# Altium schematic symbol library relay.SCHLIB: 425 symbols (part 2 of 3) (continued)
## SDS-S2
designator K?, comment RELAY   monostable, 2 x norm. open, 2 x norm. closed, 5 A/250 V AC/DC, NAiS
OC_FARNELL: unknown; OC_NEWARK: unknown
footprint SDS-S2
part A pins: 1, 12 2
part B pins: P4 P, S4 S
part C pins: P2 P, S2 S
part D pins: O1 O, P1 P
part E pins: O3 O, P3 P

## SDS-ST2
designator K?, comment RELAY   polarity, 2 x norm. open, NAiS
OC_FARNELL: unknown; OC_NEWARK: unknown
footprint SDS-ST2
part A pins: 1, 4 2
part B pins: P1 P, S1 S
part C pins: P2 P, S2 S

## SF2-*
designator K?, comment POLARISED, MONOSTABLE RELAY WITH FORCIBLY GUIDED CONTACTS NAiS   Source: http://www.mew-europe.com/.. en_ds_61404_0001.pdf
MPN: SF2-12V; MPN: SF2-24V; MF: FARNELL; OC_FARNELL: 625875; OC_NEWARK: 68C0655; OC_FARNELL: unknown; OC_NEWARK: unknown; OC_FARNELL: 1124064; OC_NEWARK: 31M0404
footprint SF2
part A pins: 1 +, 2 -
part B pins: 5 O, 6 P
part C pins: 11 P, 12 O
part D pins: 7 P, 8 S
part E pins: 9 S, 10 P

## SF3-*
designator K?, comment POLARISED, MONOSTABLE RELAY WITH FORCIBLY GUIDED CONTACTS NAiS   Source: http://www.mew-europe.com/.. en_ds_61404_0001.pdf
OC_FARNELL: unknown; OC_NEWARK: unknown
footprint SF2
part A pins: 1 +, 2 -
part B pins: 5 O, 6 P
part C pins: 7 P, 8 S
part D pins: 9 S, 10 P
part E pins: 11 P, 12 S

## SF4D-*
designator K?, comment POLARISED, MONOSTABLE RELAY WITH FORCIBLY GUIDED DOUBLE CONTACTS NAiS   Source: http://www.mew-europe.com/.. en_ds_61407_0002.pdf
OC_FARNELL: unknown; OC_NEWARK: unknown
footprint SF4D
part A pins: 1 +, 2 -
part B pins: 5 O, 6 P
part C pins: 7 P, 8 S
part D pins: 9 S, 10 P
part E pins: 11 P, 12 O
part F pins: 13 S, 14 P
part G pins: 15 P, 16 O
part H pins: 17 O, 18 P
part I pins: 19 P, 20 S

## SN*R1
designator K?, comment Slim PCB Relay 1 pole 6 A SCHRACK   Source: http://www.schrack.com/.. 5815.pdf
OC_FARNELL: unknown; OC_NEWARK: unknown
footprint SNR-V1
part A pins: A1 1, A2 2
part B pins: 11 P, 14 S

## SN*R6
designator K?, comment Slim PCB Relay 1 pole 6 A SCHRACK   Source: http://www.schrack.com/.. 5815.pdf
OC_FARNELL: unknown; OC_NEWARK: unknown
footprint SNR-H6
part A pins: A1 1, A2 2
part B pins: 11 P, 14 S

## SNR?*0
designator K?, comment Slim PCB Relay 1 pole 6 A SCHRACK   Source: http://www.schrack.com/.. 5815.pdf
OC_FARNELL: unknown; OC_NEWARK: unknown
footprint SNR-V
part A pins: A1 1, A2 2
part B pins: 11 P, 12 O, 14 S

## SNR?*5
designator K?, comment Slim PCB Relay 1 pole 6 A SCHRACK   Source: http://www.schrack.com/.. 5815.pdf
OC_FARNELL: unknown; OC_NEWARK: unknown
footprint SNR-H
part A pins: A1 1, A2 2
part B pins: 11 P, 12 O, 14 S

## SR2X5*
designator K?, comment Safety Relay 2 pole 6 A SCHRACK   Source: http://www.schrack.com/.. 5809.pdf
OC_FARNELL: unknown; OC_NEWARK: unknown
footprint SR2X
part A pins: A1 1, A2 2
part B pins: 21 O, 22 P
part C pins: 13 S, 14 P

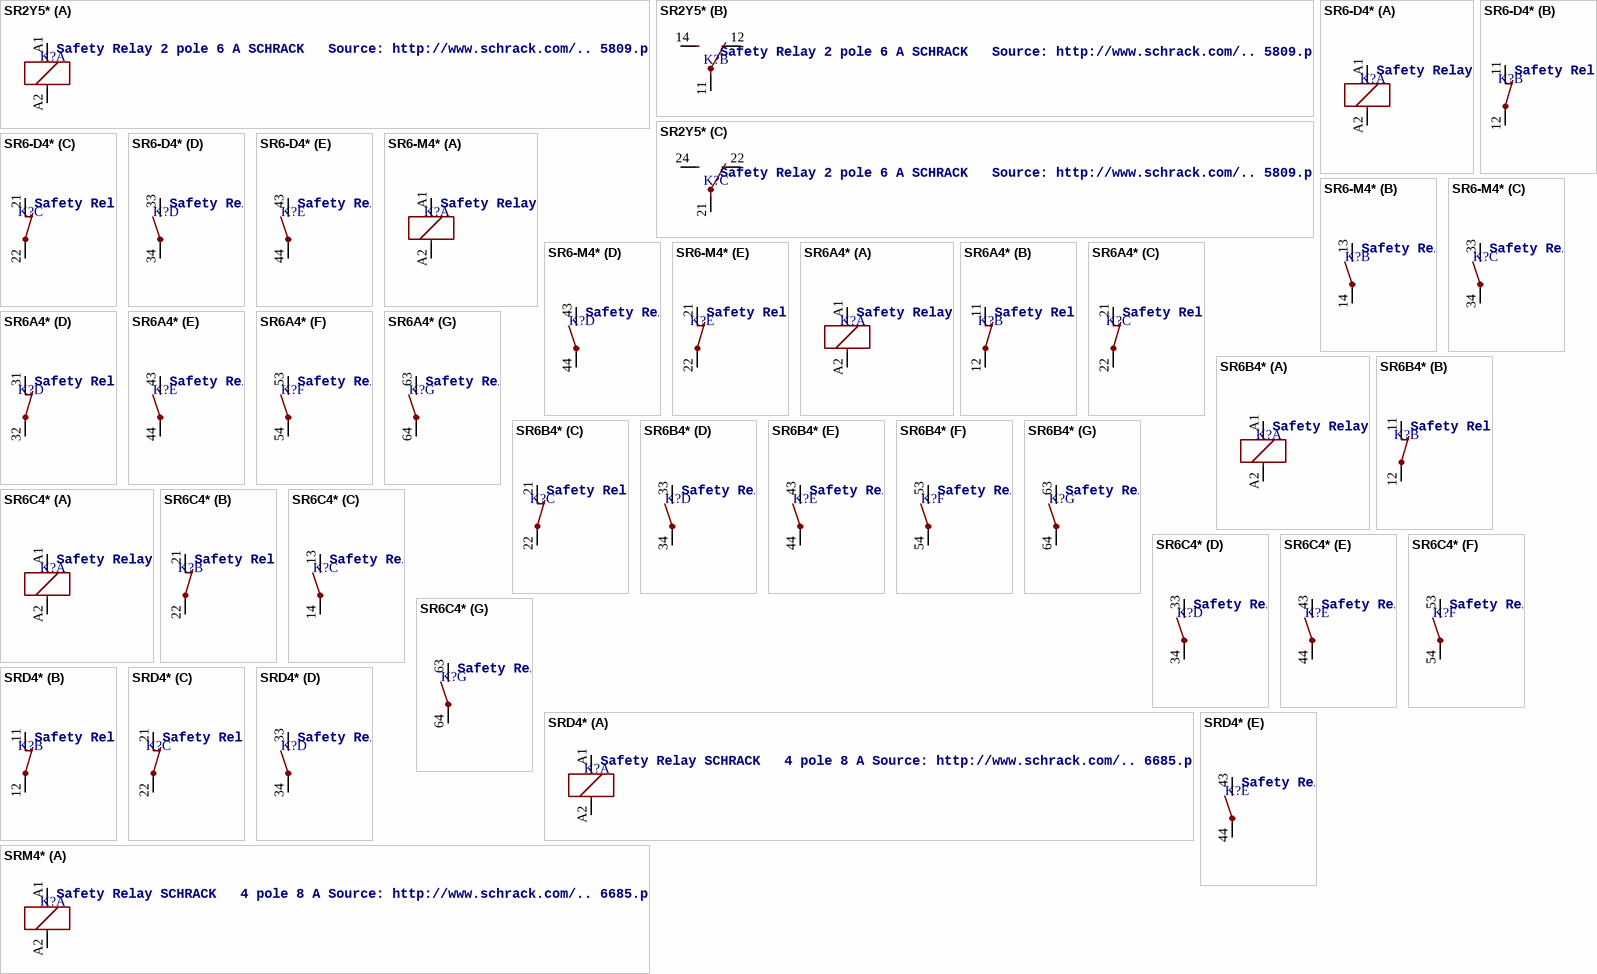
[diagram p28: symbols SR2Y5* to SRM4*]

## SR2Y5*
designator K?, comment Safety Relay 2 pole 6 A SCHRACK   Source: http://www.schrack.com/.. 5809.pdf
OC_FARNELL: unknown; OC_NEWARK: unknown
footprint SR2Y
part A pins: A1 1, A2 2
part B pins: 11 P, 12 O, 14 S
part C pins: 21 P, 22 O, 24 S

## SR6-D4*
designator K?, comment Safety Relay 4 pole 8 A SCHRACK   2 N/O contact and 2 N/C contact Source: http://www.schrack.com/.. 5814.pdf
MPN: SR6D4012; MPN: SR6D4024; MPN: SR6D4110; OC_FARNELL: unknown; OC_NEWARK: unknown; OC_FARNELL: 1770622; OC_NEWARK: 51R7440; OC_FARNELL: 1770623; OC_NEWARK: 51R7441; OC_NEWARK: 16R7721
footprint SR6-D
part A pins: A1 1, A2 2
part B pins: 11 O, 12 P
part C pins: 21 O, 22 P
part D pins: 33 S, 34 P
part E pins: 43 S, 44 P

## SR6-M4*
designator K?, comment Safety Relay 4 pole 8 A SCHRACK   3 N/O contact and 1 N/C contact Source: http://www.schrack.com/.. 5814.pdf
MPN: SR6M4012; MPN: SR6M4024; OC_FARNELL: unknown; OC_NEWARK: unknown; OC_FARNELL: 1770624; OC_NEWARK: 51R7442; OC_FARNELL: 1770625; OC_NEWARK: 51R7443
footprint SR6-M
part A pins: A1 1, A2 2
part B pins: 13 S, 14 P
part C pins: 33 S, 34 P
part D pins: 43 S, 44 P
part E pins: 21 O, 22 P

## SR6A4*
designator K?, comment Safety Relay SR6 SCHRACK   sensitive 6 pole 8 A Source: http://www.schrack.com/.. 6688.pdf
OC_FARNELL: unknown; OC_NEWARK: unknown
footprint SR6A
part A pins: A1 1, A2 2
part B pins: 11 O, 12 P
part C pins: 21 O, 22 P
part D pins: 31 O, 32 P
part E pins: 43 S, 44 P
part F pins: 53 S, 54 P
part G pins: 63 S, 64 P

## SR6B4*
designator K?, comment Safety Relay SR6 SCHRACK   sensitive 6 pole 8 A Source: http://www.schrack.com/.. 6688.pdf
OC_FARNELL: unknown; OC_NEWARK: unknown
footprint SR6B
part A pins: A1 1, A2 2
part B pins: 11 O, 12 P
part C pins: 21 O, 22 P
part D pins: 33 S, 34 P
part E pins: 43 S, 44 P
part F pins: 53 S, 54 P
part G pins: 63 S, 64 P

## SR6C4*
designator K?, comment Safety Relay SR6 SCHRACK   sensitive 6 pole 8 A Source: http://www.schrack.com/.. 6688.pdf
OC_FARNELL: unknown; OC_NEWARK: unknown
footprint SR6C
part A pins: A1 1, A2 2
part B pins: 21 O, 22 P
part C pins: 13 S, 14 P
part D pins: 33 S, 34 P
part E pins: 43 S, 44 P
part F pins: 53 S, 54 P
part G pins: 63 S, 64 P

## SRD4*
designator K?, comment Safety Relay SCHRACK   4 pole 8 A Source: http://www.schrack.com/.. 6685.pdf
OC_FARNELL: unknown; OC_NEWARK: unknown
footprint SR4
part A pins: A1 1, A2 2
part B pins: 11 O, 12 P
part C pins: 21 O, 22 P
part D pins: 33 S, 34 P
part E pins: 43 S, 44 P

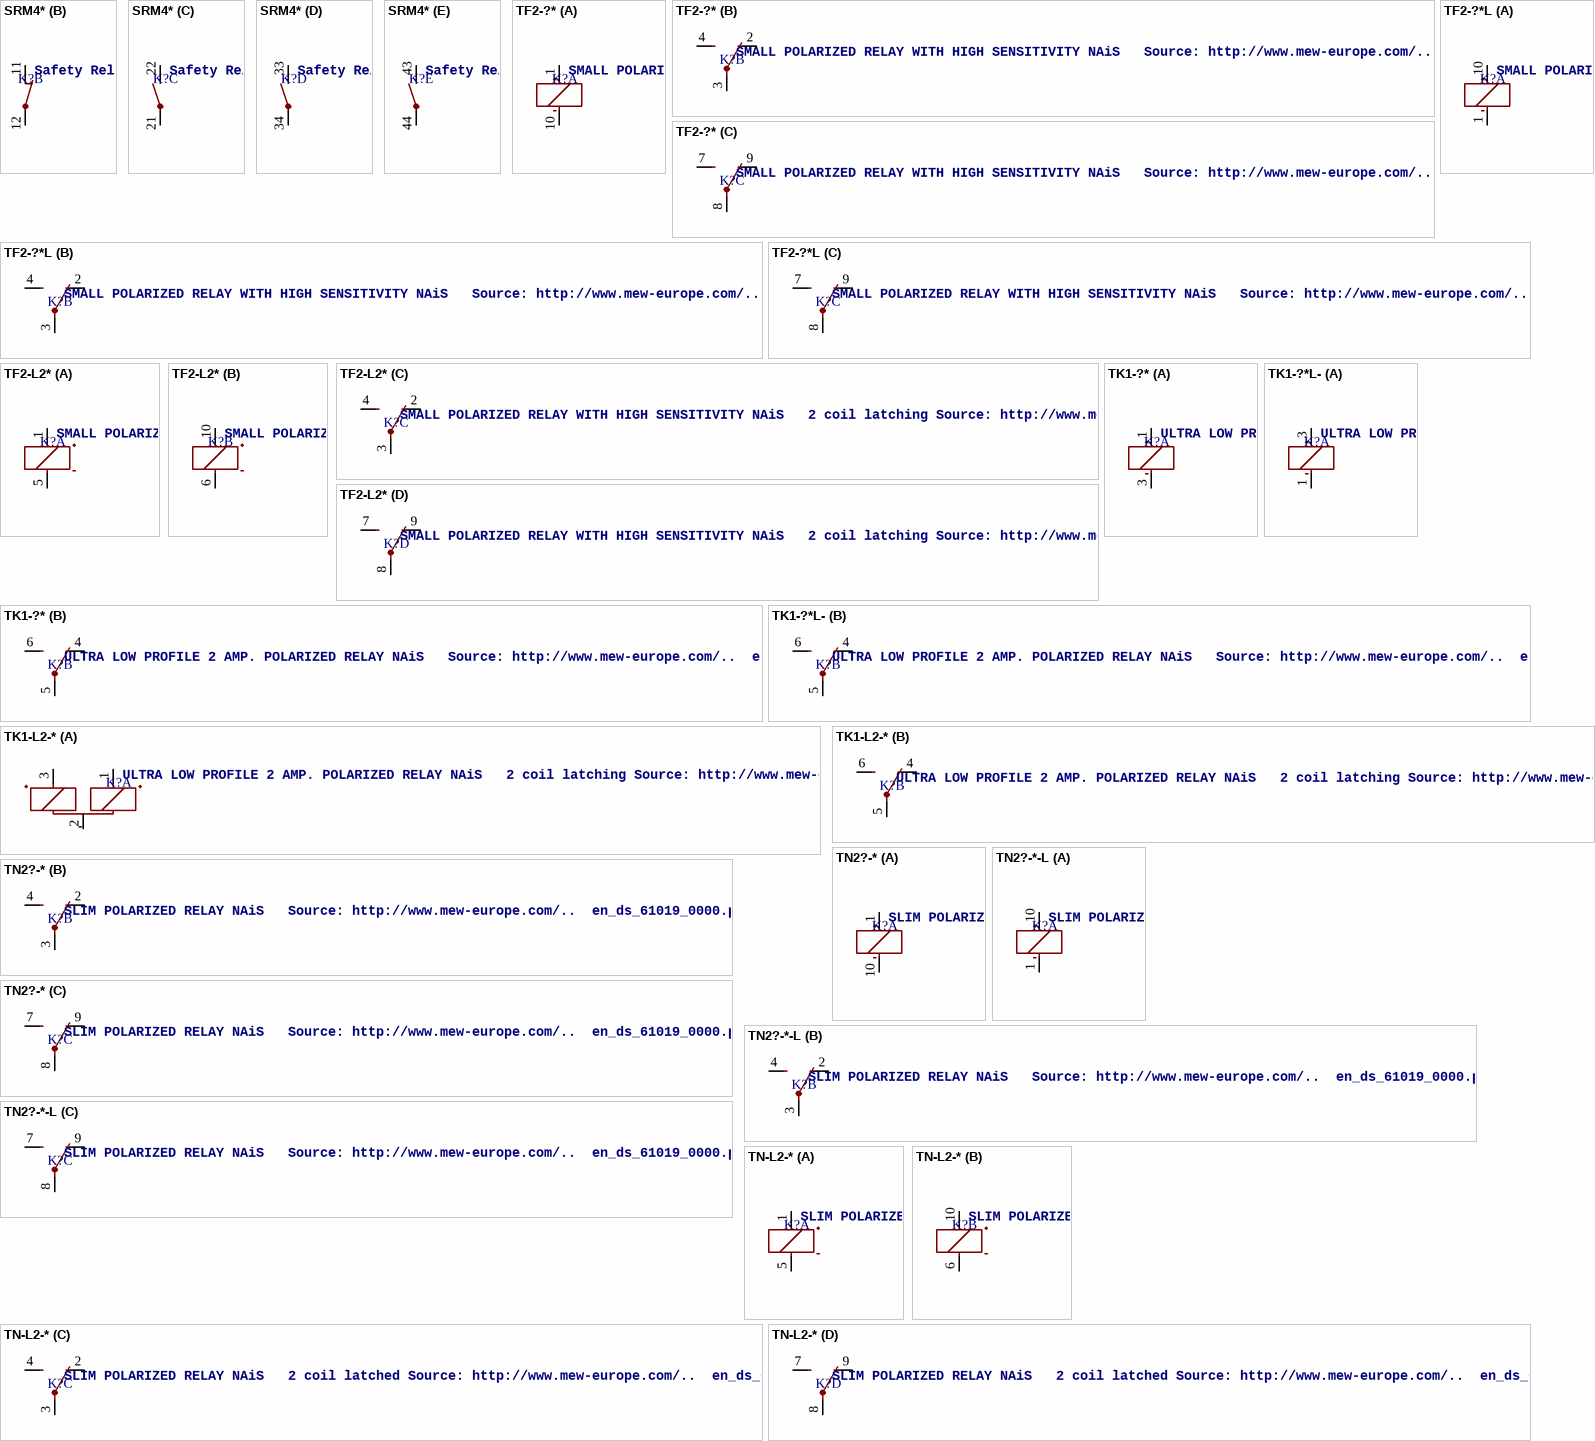
[diagram p29: symbols SRM4* to TN-L2-*]

## SRM4*
designator K?, comment Safety Relay SCHRACK   4 pole 8 A Source: http://www.schrack.com/.. 6685.pdf
OC_FARNELL: unknown; OC_NEWARK: unknown
footprint SR4
part A pins: A1 1, A2 2
part B pins: 11 O, 12 P
part C pins: 21 P, 22 S
part D pins: 33 S, 34 P
part E pins: 43 S, 44 P

## TF2-?*
designator K?, comment SMALL POLARIZED RELAY WITH HIGH SENSITIVITY NAiS   Source: http://www.mew-europe.com/..  en_ds_61017_0000.pdf
OC_FARNELL: unknown; OC_NEWARK: unknown
footprint TF2
part A pins: 1 +, 10 -
part B pins: 2 O, 3 P, 4 S
part C pins: 7 S, 8 P, 9 O

## TF2-?*L
designator K?, comment SMALL POLARIZED RELAY WITH HIGH SENSITIVITY NAiS   Source: http://www.mew-europe.com/..  en_ds_61017_0000.pdf
OC_FARNELL: 846004; OC_NEWARK: unknown; OC_FARNELL: unknown
footprint TF2
part A pins: 1 -, 10 +
part B pins: 2 O, 3 P, 4 S
part C pins: 7 S, 8 P, 9 O

## TF2-L2*
designator K?, comment SMALL POLARIZED RELAY WITH HIGH SENSITIVITY NAiS   2 coil latching Source: http://www.mew-europe.com/..  en_ds_61017_0000.pdf
OC_FARNELL: unknown; OC_NEWARK: unknown
footprint TF2
part A pins: 1 +, 5 -
part B pins: 6 -, 10 +
part C pins: 2 O, 3 P, 4 S
part D pins: 7 S, 8 P, 9 O

## TK1-?*
designator K?, comment ULTRA LOW PROFILE 2 AMP. POLARIZED RELAY NAiS   Source: http://www.mew-europe.com/..  en_ds_61018_0000.pdf
MPN: TK1-12V; MPN: TK1-24V; MPN: TK1-3V; MPN: TK1-4.5V; MPN: TK1-5V; MPN: TK1-6V; MPN: TK1-9V; MF: AROMAT/ MATSUSHITA; OC_FARNELL: unknown; OC_NEWARK: unknown; OC_FARNELL: 1380961; OC_NEWARK: 67K1254; OC_NEWARK: 64K3182; OC_NEWARK: 13P9053; OC_NEWARK: 13P9054; OC_FARNELL: 1380960; OC_NEWARK: 64K3183; OC_NEWARK: 13P9056; OC_NEWARK: 10C9734
footprint TK
part A pins: 1 +, 3 -
part B pins: 4 O, 5 P, 6 S

## TK1-?*L-
designator K?, comment ULTRA LOW PROFILE 2 AMP. POLARIZED RELAY NAiS   Source: http://www.mew-europe.com/..  en_ds_61018_0000.pdf
MPN: TK1-L-1.5V; MPN: TK1-L-12V; MPN: TK1-L-3V; MPN: TK1-L-5V; MPN: TK1-L-6V; MF: AROMAT/ MATSUSHITA; OC_FARNELL: unknown; OC_NEWARK: 10C9715; OC_NEWARK: 15P9750; OC_NEWARK: unknown; OC_NEWARK: 10C9718; OC_NEWARK: 10C9720; OC_NEWARK: 13P9050
footprint TK
part A pins: 1 -, 3 +
part B pins: 4 O, 5 P, 6 S

## TK1-L2-*
designator K?, comment ULTRA LOW PROFILE 2 AMP. POLARIZED RELAY NAiS   2 coil latching Source: http://www.mew-europe.com/..  en_ds_61018_0000.pdf
MPN: TK1-L2-12V; MPN: TK1-L2-24V; MPN: TK1-L2-3V; MPN: TK1-L2-4.5V; MPN: TK1-L2-5V; OC_FARNELL: unknown; OC_NEWARK: unknown; OC_NEWARK: 15P9751; OC_NEWARK: 15P9752; OC_NEWARK: 15P9753; OC_NEWARK: 15P9754; OC_NEWARK: 15P9755
footprint TK
part A pins: 1 R+, 2 -, 3 S+
part B pins: 4 O, 5 P, 6 S

## TN2?-*
designator K?, comment SLIM POLARIZED RELAY NAiS   Source: http://www.mew-europe.com/..  en_ds_61019_0000.pdf
MPN: TN2-12V; MPN: TN2-24V; MPN: TN2-3V; MPN: TN2-4.5V; MPN: TN2-48V; MPN: TN2-5V; MPN: TN2-6V; MPN: TN2-9V; MF: AROMAT/ MATSUSHITA; OC_FARNELL: 1200956; OC_NEWARK: 65K1079; OC_FARNELL: 910405; OC_NEWARK: 64K3187; OC_FARNELL: unknown; OC_NEWARK: 90F3177; OC_FARNELL: 1231845; OC_NEWARK: 64K3188; OC_NEWARK: 13P9184; OC_FARNELL: 1200955; OC_NEWARK: 64K3189; OC_NEWARK: 90F3180; OC_NEWARK: 90F3181
footprint TN2
part A pins: 1 +, 10 -
part B pins: 2 O, 3 P, 4 S
part C pins: 7 S, 8 P, 9 O

## TN2?-*-L
designator K?, comment SLIM POLARIZED RELAY NAiS   Source: http://www.mew-europe.com/..  en_ds_61019_0000.pdf
MPN: TN2-L-12V; MPN: TN2-L-3V; MPN: TN2-L-4.5V; MPN: TN2-L-6V; MF: AROMAT/ MATSUSHITA; OC_FARNELL: unknown; OC_NEWARK: 90F3171; OC_NEWARK: unknown; OC_NEWARK: 90F3184; OC_NEWARK: 15P9757; OC_NEWARK: 90F3169
footprint TN2
part A pins: 1 -, 10 +
part B pins: 2 O, 3 P, 4 S
part C pins: 7 S, 8 P, 9 O

## TN-L2-*
designator K?, comment SLIM POLARIZED RELAY NAiS   2 coil latched Source: http://www.mew-europe.com/..  en_ds_61019_0000.pdf
OC_FARNELL: unknown; OC_NEWARK: unknown
footprint TN2
part A pins: 1 +, 5 -
part B pins: 6 -, 10 +
part C pins: 2 O, 3 P, 4 S
part D pins: 7 S, 8 P, 9 O

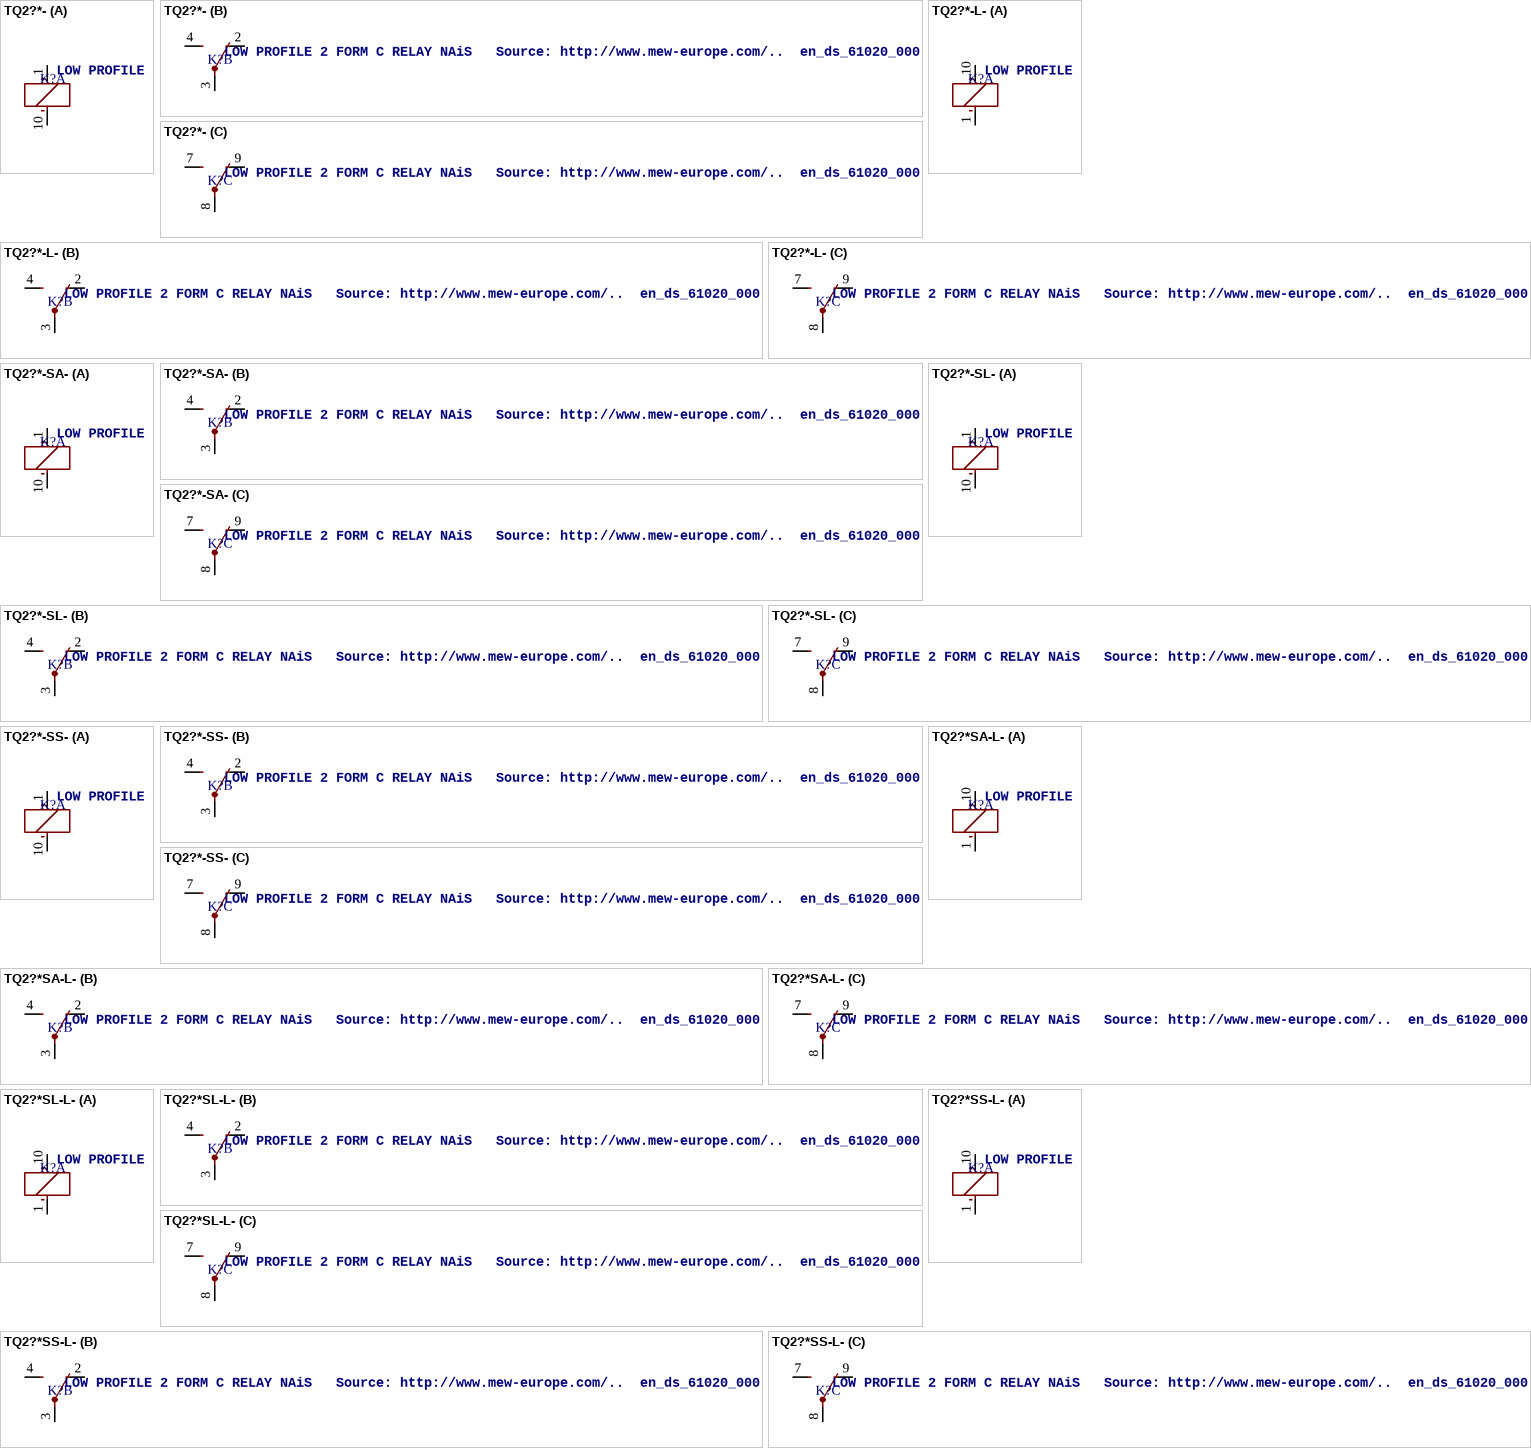
[diagram p30: symbols TQ2?*- to TQ2?*SS-L-]

## TQ2?*-
designator K?, comment LOW PROFILE 2 FORM C RELAY NAiS   Source: http://www.mew-europe.com/..  en_ds_61020_0001.pdf Source: http://www.mew-europe.com/..  en_ds_61020_0004.pdf
MPN: TQ2-12V; MPN: TQ2-24V; MPN: TQ2-3V; MPN: TQ2-4.5V; MPN: TQ2-48V; MPN: TQ2-5V; MPN: TQ2-6V; MPN: TQ2-9V; MF: AROMAT/ MATSUSHITA; OC_FARNELL: 1200949; OC_NEWARK: 64K3197; OC_FARNELL: 1175717; OC_NEWARK: 64K3198; OC_FARNELL: 1703746; OC_NEWARK: 73K2455; OC_FARNELL: 1163566; OC_NEWARK: 64K3199; OC_FARNELL: unknown; OC_NEWARK: 13P9197; OC_FARNELL: 1175716; OC_NEWARK: 64K3200; OC_NEWARK: 64K3201; OC_NEWARK: 13P9201
footprint TQ2
part A pins: 1 +, 10 -
part B pins: 2 O, 3 P, 4 S
part C pins: 7 S, 8 P, 9 O

## TQ2?*-L-
designator K?, comment LOW PROFILE 2 FORM C RELAY NAiS   Source: http://www.mew-europe.com/..  en_ds_61020_0001.pdf Source: http://www.mew-europe.com/..  en_ds_61020_0004.pdf
MPN: TQ2-L-12V; MPN: TQ2-L-3V; MPN: TQ2-L-4.5V; MPN: TQ2-L-5V; MF: AROMAT/ MATSUSHITA; OC_FARNELL: unknown; OC_NEWARK: 64K3190; OC_NEWARK: unknown; OC_NEWARK: 87F3168; OC_NEWARK: 15P9767; OC_FARNELL: 1448361; OC_NEWARK: 64K3191
footprint TQ2
part A pins: 1 -, 10 +
part B pins: 2 O, 3 P, 4 S
part C pins: 7 S, 8 P, 9 O

## TQ2?*-SA-
designator K?, comment LOW PROFILE 2 FORM C RELAY NAiS   Source: http://www.mew-europe.com/..  en_ds_61020_0001.pdf Source: http://www.mew-europe.com/..  en_ds_61020_0004.pdf
MPN: TQ2SA-1.5V-Z; MPN: TQ2SA-12V; MPN: TQ2SA-24V; MPN: TQ2SA-3V; MPN: TQ2SA-4.5V; MPN: TQ2SA-48V; MPN: TQ2SA-5V; MPN: TQ2SA-6V; MPN: TQ2SA-9V; MF: AROMAT/ MATSUSHITA; OC_FARNELL: unknown; OC_NEWARK: 13P9205; OC_FARNELL: 1124056; OC_NEWARK: 64K3203; OC_NEWARK: 13P9208; OC_NEWARK: 10C9847; OC_NEWARK: 92B3979; OC_NEWARK: 13P9215; OC_FARNELL: 1124054; OC_NEWARK: 64K3205; OC_NEWARK: 13P9219; OC_NEWARK: 13P9220
footprint TQ-SA
part A pins: 1 +, 10 -
part B pins: 2 O, 3 P, 4 S
part C pins: 7 S, 8 P, 9 O

## TQ2?*-SL-
designator K?, comment LOW PROFILE 2 FORM C RELAY NAiS   Source: http://www.mew-europe.com/..  en_ds_61020_0001.pdf Source: http://www.mew-europe.com/..  en_ds_61020_0004.pdf
MPN: TQ2SL-12V; MPN: TQ2SL-24V; MPN: TQ2SL-3V; MPN: TQ2SL-5V; OC_FARNELL: unknown; OC_NEWARK: unknown; OC_NEWARK: 13P9222; OC_NEWARK: 13P9224; OC_NEWARK: 13P9226; OC_NEWARK: 13P9228
footprint TQ-SL
part A pins: 1 +, 10 -
part B pins: 2 O, 3 P, 4 S
part C pins: 7 S, 8 P, 9 O

## TQ2?*-SS-
designator K?, comment LOW PROFILE 2 FORM C RELAY NAiS   Source: http://www.mew-europe.com/..  en_ds_61020_0001.pdf Source: http://www.mew-europe.com/..  en_ds_61020_0004.pdf
MPN: TQ2SS-1.5V; MPN: TQ2SS-12V; MPN: TQ2SS-24V-Z; MPN: TQ2SS-3V; MPN: TQ2SS-4.5V; MPN: TQ2SS-48V; MPN: TQ2SS-5V; MF: AROMAT/ MATSUSHITA; OC_FARNELL: unknown; OC_NEWARK: 13P9230; OC_NEWARK: 13P9231; OC_NEWARK: 13P9232; OC_NEWARK: 10C9995; OC_NEWARK: 13P9234; OC_NEWARK: 11C0002; OC_NEWARK: 11C0005; OC_NEWARK: unknown
footprint TQ-SS
part A pins: 1 +, 10 -
part B pins: 2 O, 3 P, 4 S
part C pins: 7 S, 8 P, 9 O

## TQ2?*SA-L-
designator K?, comment LOW PROFILE 2 FORM C RELAY NAiS   Source: http://www.mew-europe.com/..  en_ds_61020_0001.pdf Source: http://www.mew-europe.com/..  en_ds_61020_0004.pdf
MPN: TQ2SA-L-12V; MPN: TQ2SA-L-3V; MPN: TQ2SA-L-4.5V; MPN: TQ2SA-L-5V; OC_FARNELL: unknown; OC_NEWARK: unknown; OC_NEWARK: 15P9777; OC_NEWARK: 15P9778; OC_NEWARK: 15P9779; OC_NEWARK: 15P9780
footprint TQ-SA
part A pins: 1 -, 10 +
part B pins: 2 O, 3 P, 4 S
part C pins: 7 S, 8 P, 9 O

## TQ2?*SL-L-
designator K?, comment LOW PROFILE 2 FORM C RELAY NAiS   Source: http://www.mew-europe.com/..  en_ds_61020_0001.pdf Source: http://www.mew-europe.com/..  en_ds_61020_0004.pdf
MPN: TQ2SL-L-24V; MPN: TQ2SL-L-3V; MF: AROMAT/ MATSUSHITA; OC_FARNELL: unknown; OC_NEWARK: unknown; OC_NEWARK: 10C9870; OC_NEWARK: 15P9793
footprint TQ-SL
part A pins: 1 -, 10 +
part B pins: 2 O, 3 P, 4 S
part C pins: 7 S, 8 P, 9 O

## TQ2?*SS-L-
designator K?, comment LOW PROFILE 2 FORM C RELAY NAiS   Source: http://www.mew-europe.com/..  en_ds_61020_0001.pdf Source: http://www.mew-europe.com/..  en_ds_61020_0004.pdf
MPN: TQ2SS-L-4.5V; MPN: TQ2SS-L-5V; MF: AROMAT/ MATSUSHITA; OC_FARNELL: unknown; OC_NEWARK: unknown; OC_NEWARK: 10C9950; OC_NEWARK: 15P9797
footprint TQ-SS
part A pins: 1 -, 10 +
part B pins: 2 O, 3 P, 4 S
part C pins: 7 S, 8 P, 9 O

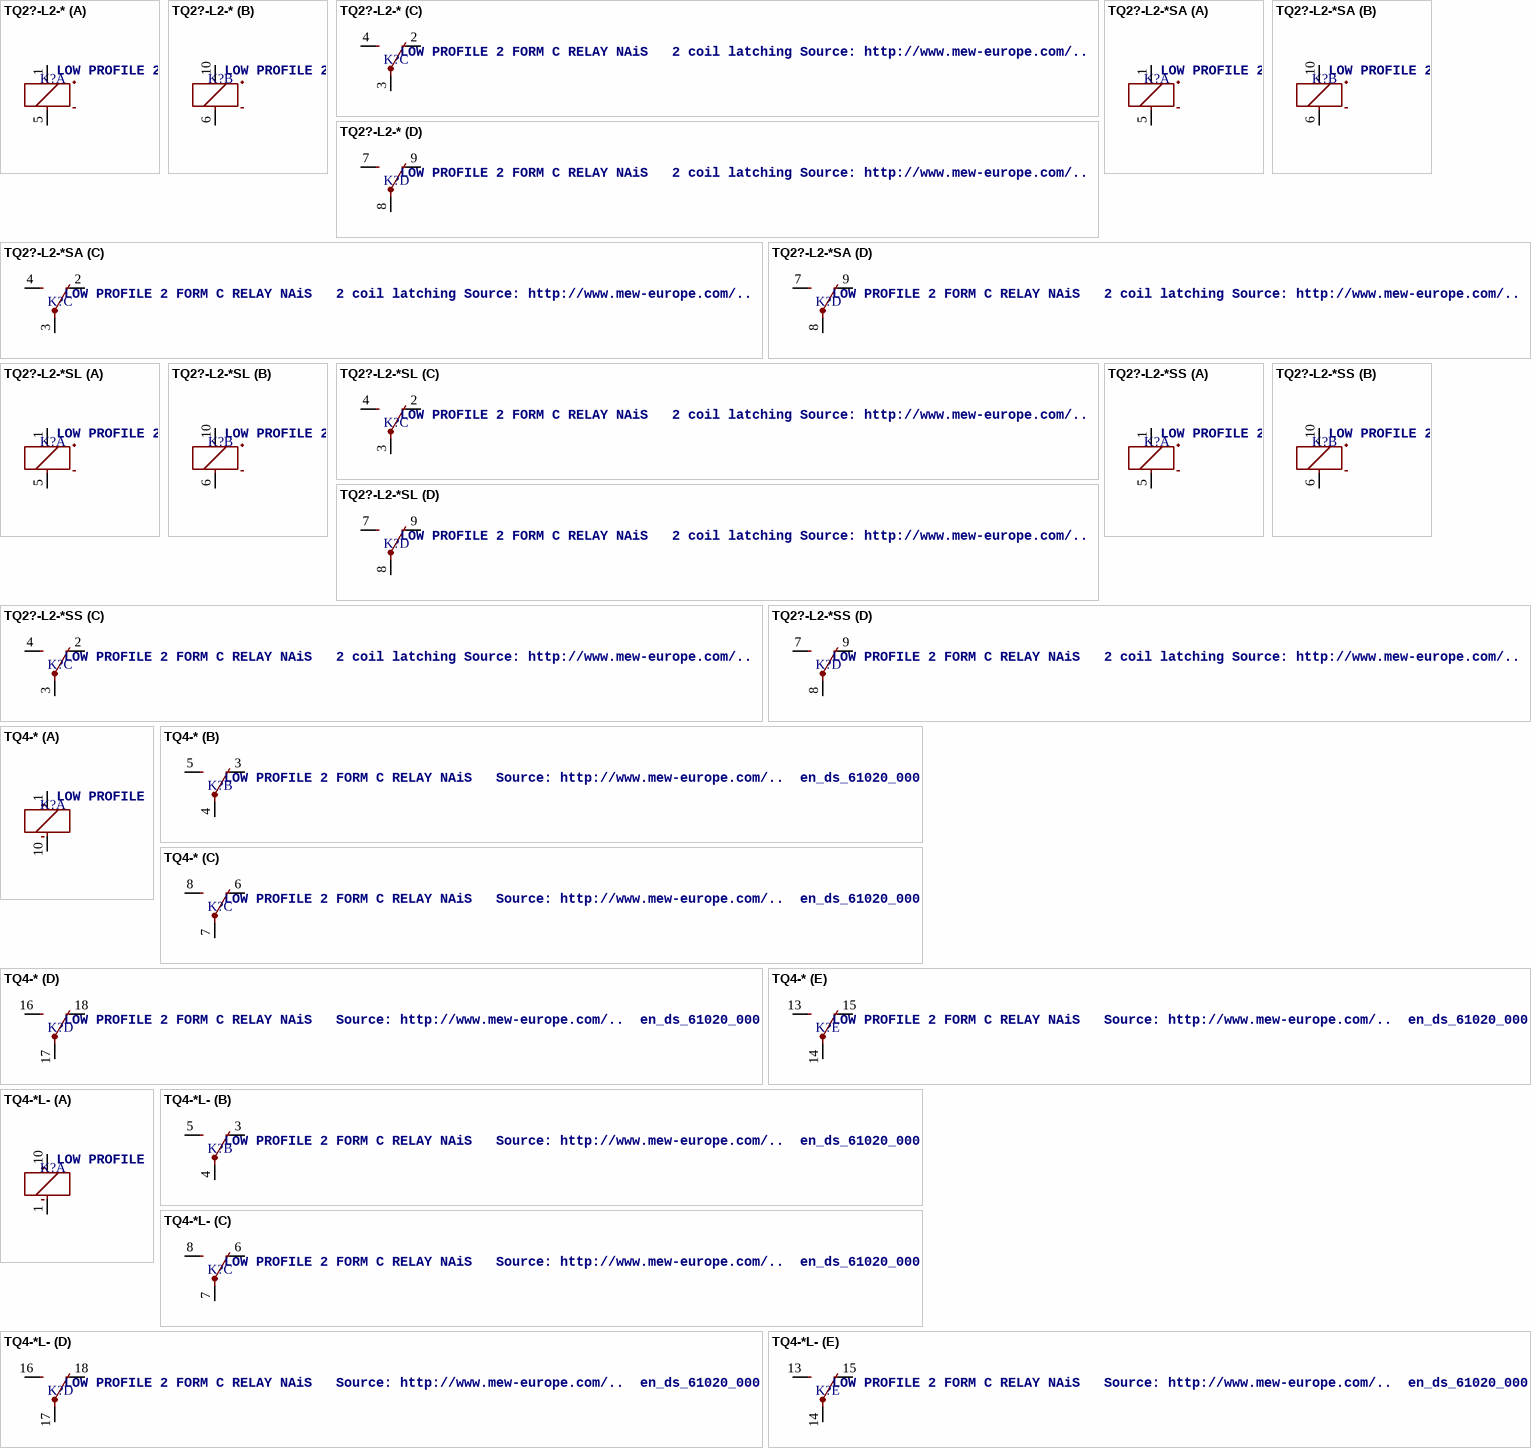
[diagram p31: symbols TQ2?-L2-* to TQ4-*L-]

## TQ2?-L2-*
designator K?, comment LOW PROFILE 2 FORM C RELAY NAiS   2 coil latching Source: http://www.mew-europe.com/..  en_ds_61020_0001.pdf Source: http://www.mew-europe.com/..  en_ds_61020_0002.pdf
MPN: TQ2-L2-9V; MF: AROMAT/ MATSUSHITA; OC_FARNELL: 1217662; OC_NEWARK: 64K3196
footprint TQ2
part A pins: 1 +, 5 -
part B pins: 6 -, 10 +
part C pins: 2 O, 3 P, 4 S
part D pins: 7 S, 8 P, 9 O

## TQ2?-L2-*SA
designator K?, comment LOW PROFILE 2 FORM C RELAY NAiS   2 coil latching Source: http://www.mew-europe.com/..  en_ds_61020_0001.pdf Source: http://www.mew-europe.com/..  en_ds_61020_0002.pdf
MPN: TQ2SA-L2-12V; MPN: TQ2SA-L2-24V; MPN: TQ2SA-L2-3V; MPN: TQ2SA-L2-4.5V; MPN: TQ2SA-L2-5V; MF: FARNELL; MF: AROMAT/ MATSUSHITA; OC_FARNELL: unknown; OC_NEWARK: unknown; OC_FARNELL: 1124058; OC_NEWARK: 02M6304; OC_FARNELL: 625784; OC_NEWARK: 15J0011; OC_NEWARK: 15P9786; OC_NEWARK: 15P9788; OC_FARNELL: 625760; OC_NEWARK: 64K3202
footprint TQ-SA
part A pins: 1 +, 5 -
part B pins: 6 -, 10 +
part C pins: 2 O, 3 P, 4 S
part D pins: 7 S, 8 P, 9 O

## TQ2?-L2-*SL
designator K?, comment LOW PROFILE 2 FORM C RELAY NAiS   2 coil latching Source: http://www.mew-europe.com/..  en_ds_61020_0001.pdf Source: http://www.mew-europe.com/..  en_ds_61020_0002.pdf
MPN: TQ2SL-L2-24V; MPN: TQ2SL-L2-3V-Z; MPN: TQ2SL-L2-4.5V; MPN: TQ2SL-L2-5V; MF: AROMAT/ MATSUSHITA; OC_FARNELL: unknown; OC_NEWARK: unknown; OC_NEWARK: 15P9794; OC_NEWARK: 10C9899; OC_NEWARK: 15P9795; OC_NEWARK: 15P9796
footprint TQ-SL
part A pins: 1 +, 5 -
part B pins: 6 -, 10 +
part C pins: 2 O, 3 P, 4 S
part D pins: 7 S, 8 P, 9 O

## TQ2?-L2-*SS
designator K?, comment LOW PROFILE 2 FORM C RELAY NAiS   2 coil latching Source: http://www.mew-europe.com/..  en_ds_61020_0001.pdf Source: http://www.mew-europe.com/..  en_ds_61020_0002.pdf
MPN: TQ2SS-L2-12V; MPN: TQ2SS-L2-24V; MPN: TQ2SS-L2-3V; MPN: TQ2SS-L2-4.5V-Z; MPN: TQ2SS-L2-5V; MF: AROMAT/ MATSUSHITA; OC_FARNELL: unknown; OC_NEWARK: unknown; OC_NEWARK: 15P9800; OC_NEWARK: 15P9801; OC_NEWARK: 15P9802; OC_NEWARK: 15P9803; OC_NEWARK: 64K3206
footprint TQ-SS
part A pins: 1 +, 5 -
part B pins: 6 -, 10 +
part C pins: 2 O, 3 P, 4 S
part D pins: 7 S, 8 P, 9 O

## TQ4-*
designator K?, comment LOW PROFILE 2 FORM C RELAY NAiS   Source: http://www.mew-europe.com/..  en_ds_61020_0001.pdf
MPN: TQ4-24V; MPN: TQ4-3V; MPN: TQ4-4.5V; MPN: TQ4-5V; MF: AROMAT/ MATSUSHITA; OC_FARNELL: unknown; OC_NEWARK: unknown; OC_FARNELL: 1608334; OC_NEWARK: 64K3210; OC_NEWARK: 13P9240; OC_NEWARK: 13P9241; OC_FARNELL: 1448362; OC_NEWARK: 67K1293
footprint TQ4
part A pins: 1 +, 10 -
part B pins: 3 O, 4 P, 5 S
part C pins: 6 O, 7 P, 8 S
part D pins: 16 S, 17 P, 18 O
part E pins: 13 S, 14 P, 15 O

## TQ4-*L-
designator K?, comment LOW PROFILE 2 FORM C RELAY NAiS   Source: http://www.mew-europe.com/..  en_ds_61020_0001.pdf
OC_FARNELL: unknown; OC_NEWARK: unknown; OC_FARNELL: 1448362
footprint TQ4
part A pins: 1 -, 10 +
part B pins: 3 O, 4 P, 5 S
part C pins: 6 O, 7 P, 8 S
part D pins: 16 S, 17 P, 18 O
part E pins: 13 S, 14 P, 15 O

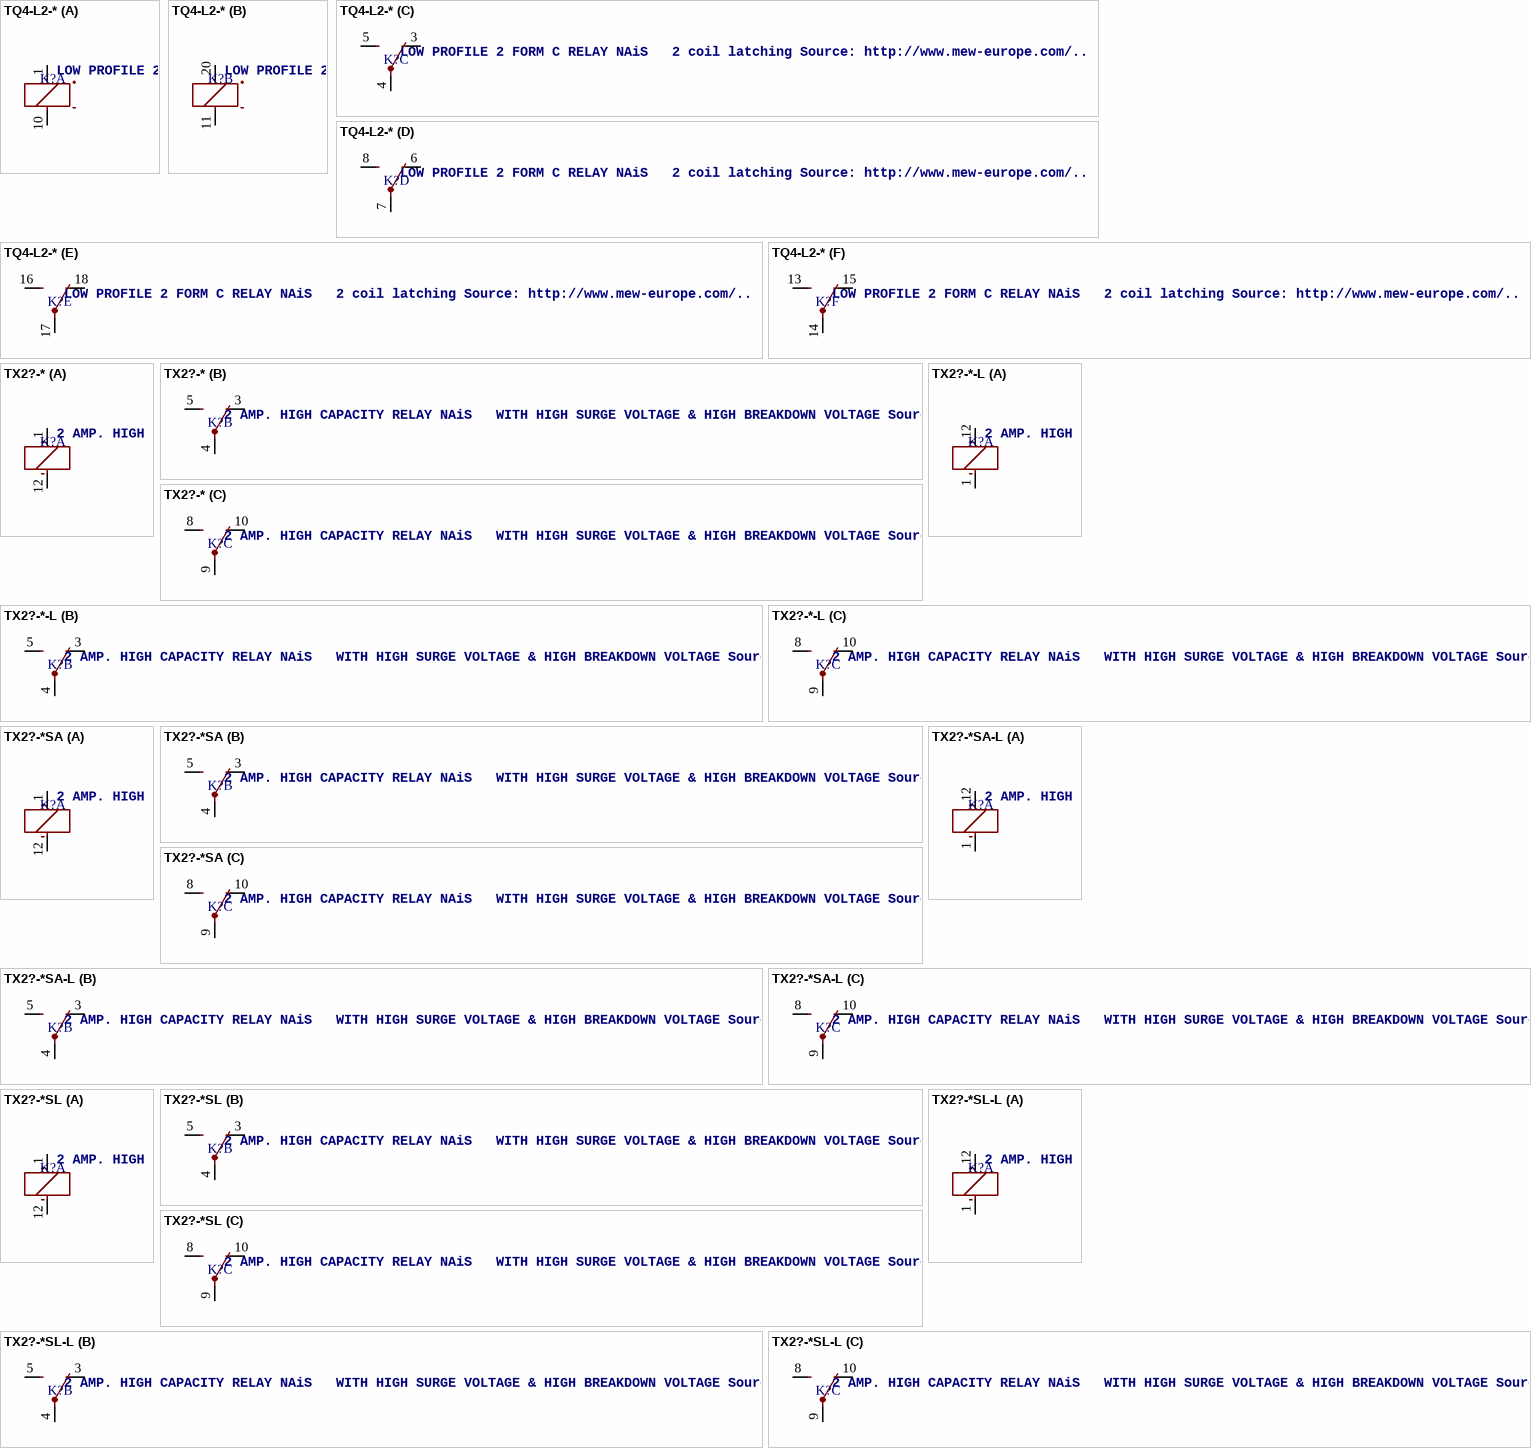
[diagram p32: symbols TQ4-L2-* to TX2?-*SL-L]

## TQ4-L2-*
designator K?, comment LOW PROFILE 2 FORM C RELAY NAiS   2 coil latching Source: http://www.mew-europe.com/..  en_ds_61020_0001.pdf
MPN: TQ4-L2-12V; MPN: TQ4-L2-24V; MPN: TQ4-L2-5V; MF: AROMAT/ MATSUSHITA; OC_FARNELL: unknown; OC_NEWARK: 90F5822; OC_NEWARK: 15P9807; OC_NEWARK: unknown; OC_NEWARK: 64K3208
footprint TQ4
part A pins: 1 +, 10 -
part B pins: 11 -, 20 +
part C pins: 3 O, 4 P, 5 S
part D pins: 6 O, 7 P, 8 S
part E pins: 16 S, 17 P, 18 O
part F pins: 13 S, 14 P, 15 O

## TX2?-*
designator K?, comment 2 AMP. HIGH CAPACITY RELAY NAiS   WITH HIGH SURGE VOLTAGE & HIGH BREAKDOWN VOLTAGE Source: http://www.mew-europe.com/..  en_ds_61022_0001.pdf
MPN: TX2-1.5V; MPN: TX2-12V; MPN: TX2-24V; MPN: TX2-3V; MPN: TX2-4.5V; MPN: TX2-5V; MPN: TX2-6V; MPN: TX2-9V; MF: AROMAT/ MATSUSHITA; OC_FARNELL: unknown; OC_NEWARK: 13P9570; OC_FARNELL: 1200952; OC_NEWARK: 67K1295; OC_FARNELL: 1124059; OC_NEWARK: 64K3215; OC_NEWARK: 13P9573; OC_FARNELL: 1200950; OC_NEWARK: 64K3216; OC_NEWARK: 67K1296; OC_NEWARK: 11C0387; OC_NEWARK: 11C0388
footprint TX2
part A pins: 1 +, 12 -
part B pins: 3 O, 4 P, 5 S
part C pins: 8 S, 9 P, 10 O

## TX2?-*-L
designator K?, comment 2 AMP. HIGH CAPACITY RELAY NAiS   WITH HIGH SURGE VOLTAGE & HIGH BREAKDOWN VOLTAGE Source: http://www.mew-europe.com/..  en_ds_61022_0001.pdf
MPN: TX2-L-12V; MPN: TX2-L-24V-1; MPN: TX2-L-3V; MPN: TX2-L-4.5V; MPN: TX2-L-5V; MPN: TX2-L-9V; OC_FARNELL: unknown; OC_NEWARK: unknown; OC_NEWARK: 11C0367; OC_NEWARK: 12N3976; OC_NEWARK: 15P9975; OC_NEWARK: 15P9976; OC_NEWARK: 15P9977; OC_NEWARK: 15P9978
footprint TX2
part A pins: 1 -, 12 +
part B pins: 3 O, 4 P, 5 S
part C pins: 8 S, 9 P, 10 O

## TX2?-*SA
designator K?, comment 2 AMP. HIGH CAPACITY RELAY NAiS   WITH HIGH SURGE VOLTAGE & HIGH BREAKDOWN VOLTAGE Source: http://www.mew-europe.com/..  en_ds_61022_0001.pdf
MPN: TX2SA-12V; MPN: TX2SA-24V; MPN: TX2SA-3V; MPN: TX2SA-4.5V; MPN: TX2SA-5V; MPN: TX2SA-6V-X; MPN: TX2SA-9V; MF: AROMAT/ MATSUSHITA; OC_FARNELL: unknown; OC_NEWARK: unknown; OC_FARNELL: 910480; OC_NEWARK: 64K3217; OC_FARNELL: 1652603; OC_NEWARK: 64K3218; OC_NEWARK: 13P9584; OC_NEWARK: 92F1604; OC_FARNELL: 1200957; OC_NEWARK: 13P9589; OC_NEWARK: 13P9592; OC_NEWARK: 13P9593
footprint TX2SA
part A pins: 1 +, 12 -
part B pins: 3 O, 4 P, 5 S
part C pins: 8 S, 9 P, 10 O

## TX2?-*SA-L
designator K?, comment 2 AMP. HIGH CAPACITY RELAY NAiS   WITH HIGH SURGE VOLTAGE & HIGH BREAKDOWN VOLTAGE Source: http://www.mew-europe.com/..  en_ds_61022_0001.pdf
OC_FARNELL: unknown; OC_NEWARK: unknown
footprint TX2SA
part A pins: 1 -, 12 +
part B pins: 3 O, 4 P, 5 S
part C pins: 8 S, 9 P, 10 O

## TX2?-*SL
designator K?, comment 2 AMP. HIGH CAPACITY RELAY NAiS   WITH HIGH SURGE VOLTAGE & HIGH BREAKDOWN VOLTAGE Source: http://www.mew-europe.com/..  en_ds_61022_0001.pdf
MPN: TX2SL-12V; MPN: TX2SL-24V; MPN: TX2SL-3V; MPN: TX2SL-4.5V; MPN: TX2SL-48V; MPN: TX2SL-5V; MPN: TX2SL-9V-1; MF: AROMAT/ MATSUSHITA; OC_FARNELL: unknown; OC_NEWARK: unknown; OC_NEWARK: 11C0519; OC_NEWARK: 16P9442; OC_NEWARK: 13P9598; OC_NEWARK: 13P9600; OC_NEWARK: 13P9602; OC_NEWARK: 13P9603; OC_NEWARK: 11N6123
footprint TX2SL
part A pins: 1 +, 12 -
part B pins: 3 O, 4 P, 5 S
part C pins: 8 S, 9 P, 10 O

## TX2?-*SL-L
designator K?, comment 2 AMP. HIGH CAPACITY RELAY NAiS   WITH HIGH SURGE VOLTAGE & HIGH BREAKDOWN VOLTAGE Source: http://www.mew-europe.com/..  en_ds_61022_0001.pdf
MPN: TX2SL-L-24V-1; MPN: TX2SL-L-3V; MF: AROMAT/ MATSUSHITA; OC_FARNELL: unknown; OC_NEWARK: unknown; OC_NEWARK: 12N3990; OC_NEWARK: 11C0477
footprint TX2SL
part A pins: 1 -, 12 +
part B pins: 3 O, 4 P, 5 S
part C pins: 8 S, 9 P, 10 O

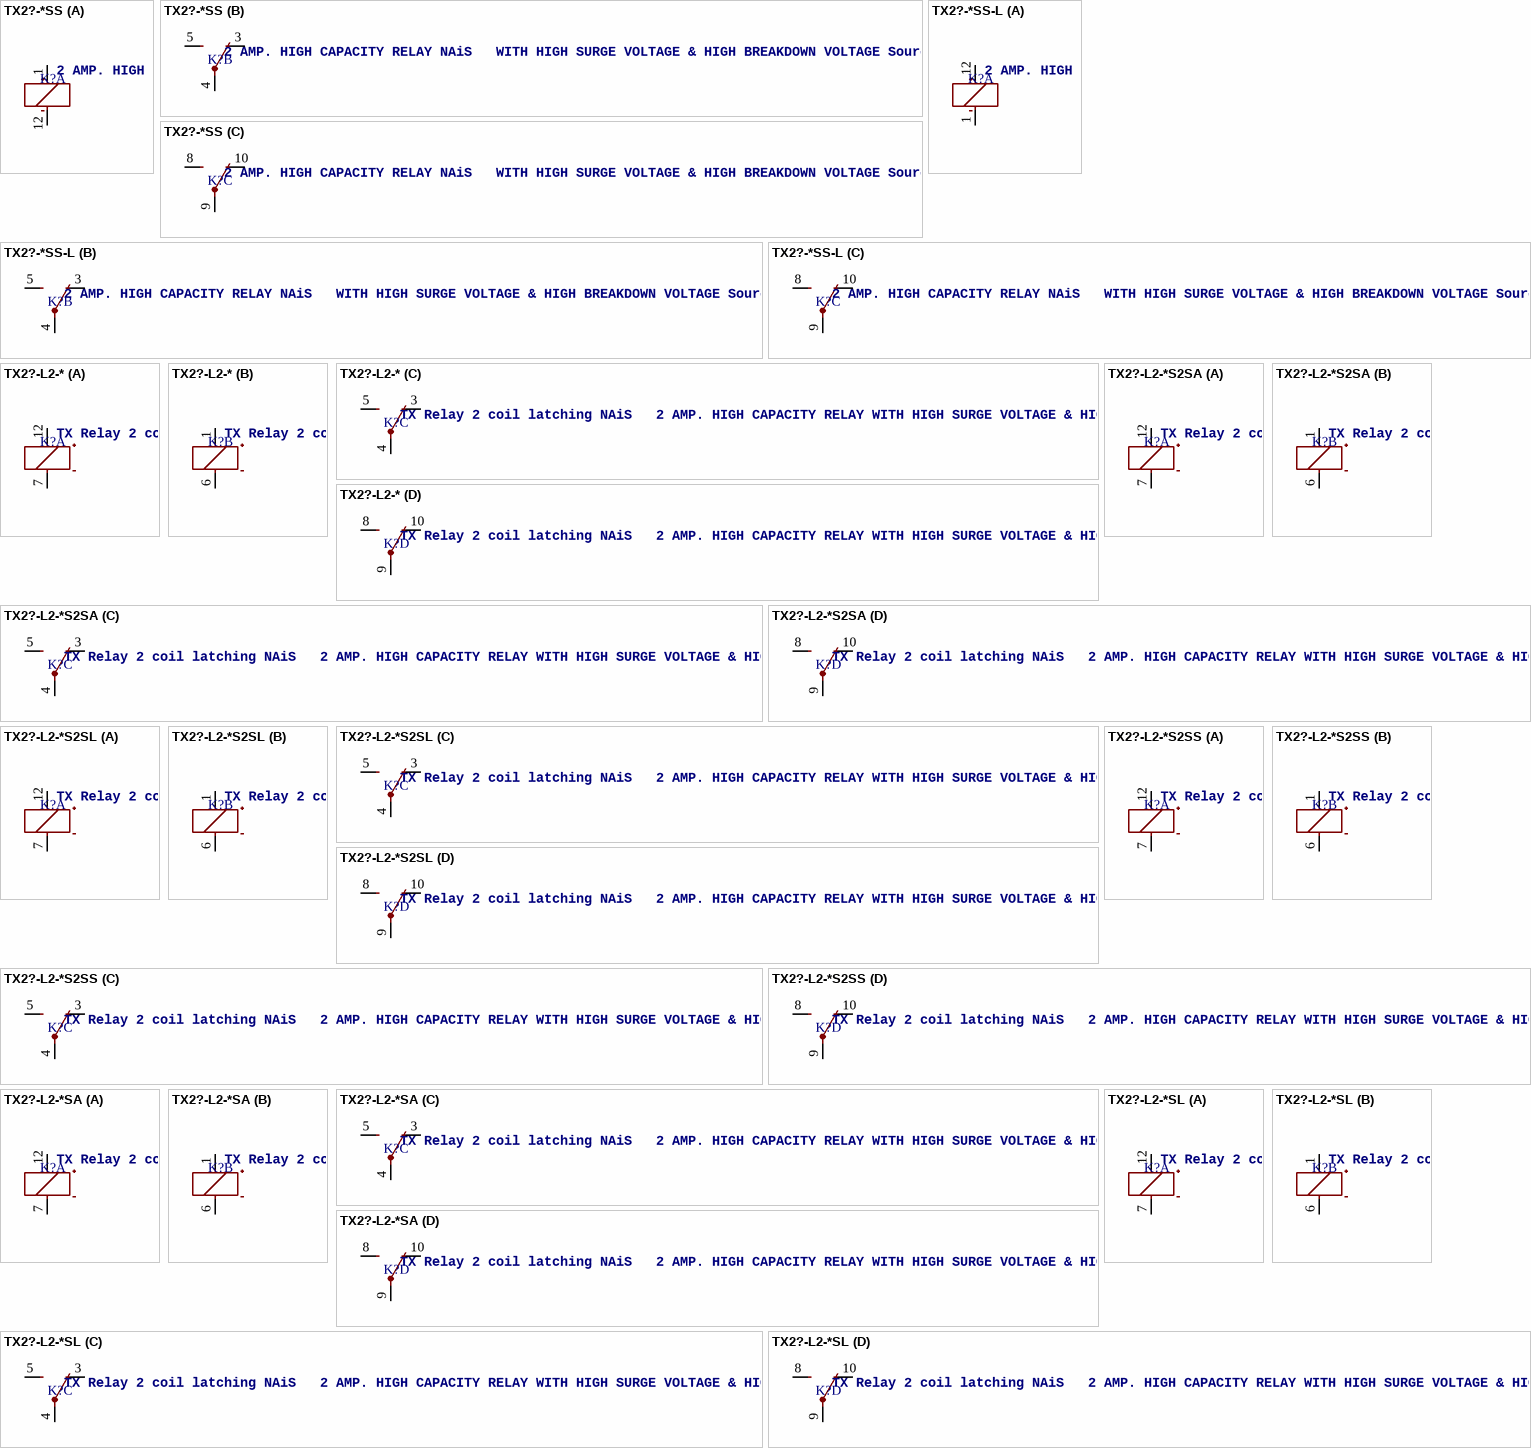
[diagram p33: symbols TX2?-*SS to TX2?-L2-*SL]

## TX2?-*SS
designator K?, comment 2 AMP. HIGH CAPACITY RELAY NAiS   WITH HIGH SURGE VOLTAGE & HIGH BREAKDOWN VOLTAGE Source: http://www.mew-europe.com/..  en_ds_61022_0001.pdf
MPN: TX2SS-24V; MPN: TX2SS-3V-Z; MPN: TX2SS-4.5V; MPN: TX2SS-48V; MPN: TX2SS-5V; OC_FARNELL: unknown; OC_NEWARK: unknown; OC_NEWARK: 13P9605; OC_NEWARK: 13P9606; OC_NEWARK: 13P9607; OC_NEWARK: 13P9609; OC_NEWARK: 13P9610
footprint TX2SS
part A pins: 1 +, 12 -
part B pins: 3 O, 4 P, 5 S
part C pins: 8 S, 9 P, 10 O

## TX2?-*SS-L
designator K?, comment 2 AMP. HIGH CAPACITY RELAY NAiS   WITH HIGH SURGE VOLTAGE & HIGH BREAKDOWN VOLTAGE Source: http://www.mew-europe.com/..  en_ds_61022_0001.pdf
MPN: TX2SS-L-12V-Z; MPN: TX2SS-L-3V-1; MF: AROMAT/ MATSUSHITA; OC_FARNELL: unknown; OC_NEWARK: unknown; OC_NEWARK: 11C0549; OC_NEWARK: 12N3991
footprint TX2SS
part A pins: 1 -, 12 +
part B pins: 3 O, 4 P, 5 S
part C pins: 8 S, 9 P, 10 O

## TX2?-L2-*
designator K?, comment TX Relay 2 coil latching NAiS   2 AMP. HIGH CAPACITY RELAY WITH HIGH SURGE VOLTAGE & HIGH BREAKDOWN VOLTAGE Source: http://www.mew-europe.com/..  en_ds_61022_0001.pdf TX-S SMALL POLARIZED WITH HIGH SENSITIVITY 50mW Source: http://www.mew-europe.com/..  en_ds_61022_0022.pdf
MPN: TX2-L2-12V; MPN: TX2-L2-24V; MPN: TX2-L2-3V-1; MPN: TX2-L2-4.5V; MPN: TX2-L2-5V; MPN: TX2-L2-9V; MF: AROMAT/ MATSUSHITA; OC_FARNELL: unknown; OC_NEWARK: unknown; OC_FARNELL: 1124060; OC_NEWARK: 64K3213; OC_FARNELL: 1124061; OC_NEWARK: 31M0467; OC_NEWARK: 12N3980; OC_NEWARK: 15P9981; OC_FARNELL: 625826; OC_NEWARK: 15P9982; OC_NEWARK: 15P9984
footprint TX2-L2
part A pins: 7 -, 12 +
part B pins: 1 +, 6 -
part C pins: 3 O, 4 P, 5 S
part D pins: 8 S, 9 P, 10 O

## TX2?-L2-*S2SA
designator K?, comment TX Relay 2 coil latching NAiS   2 AMP. HIGH CAPACITY RELAY WITH HIGH SURGE VOLTAGE & HIGH BREAKDOWN VOLTAGE Source: http://www.mew-europe.com/..  en_ds_61022_0001.pdf TX-S SMALL POLARIZED WITH HIGH SENSITIVITY 50mW Source: http://www.mew-europe.com/..  en_ds_61022_0022.pdf
OC_FARNELL: unknown; OC_NEWARK: unknown
footprint TX2SA-L2
part A pins: 7 -, 12 +
part B pins: 1 +, 6 -
part C pins: 3 O, 4 P, 5 S
part D pins: 8 S, 9 P, 10 O